# Altium footprint library con-molex.PCBLIB: 368 footprints (part 24 of 26)
Each footprint in its own frame and in the unit in brackets; x right, y up, seen from the top. Pads: shape width x height; smd on the part's side, far side on the other; paste and mask are expansions set on the pad; w line width, h text height; cw(c..) or ccw(c..) is an arc to the next point about the centre after c.
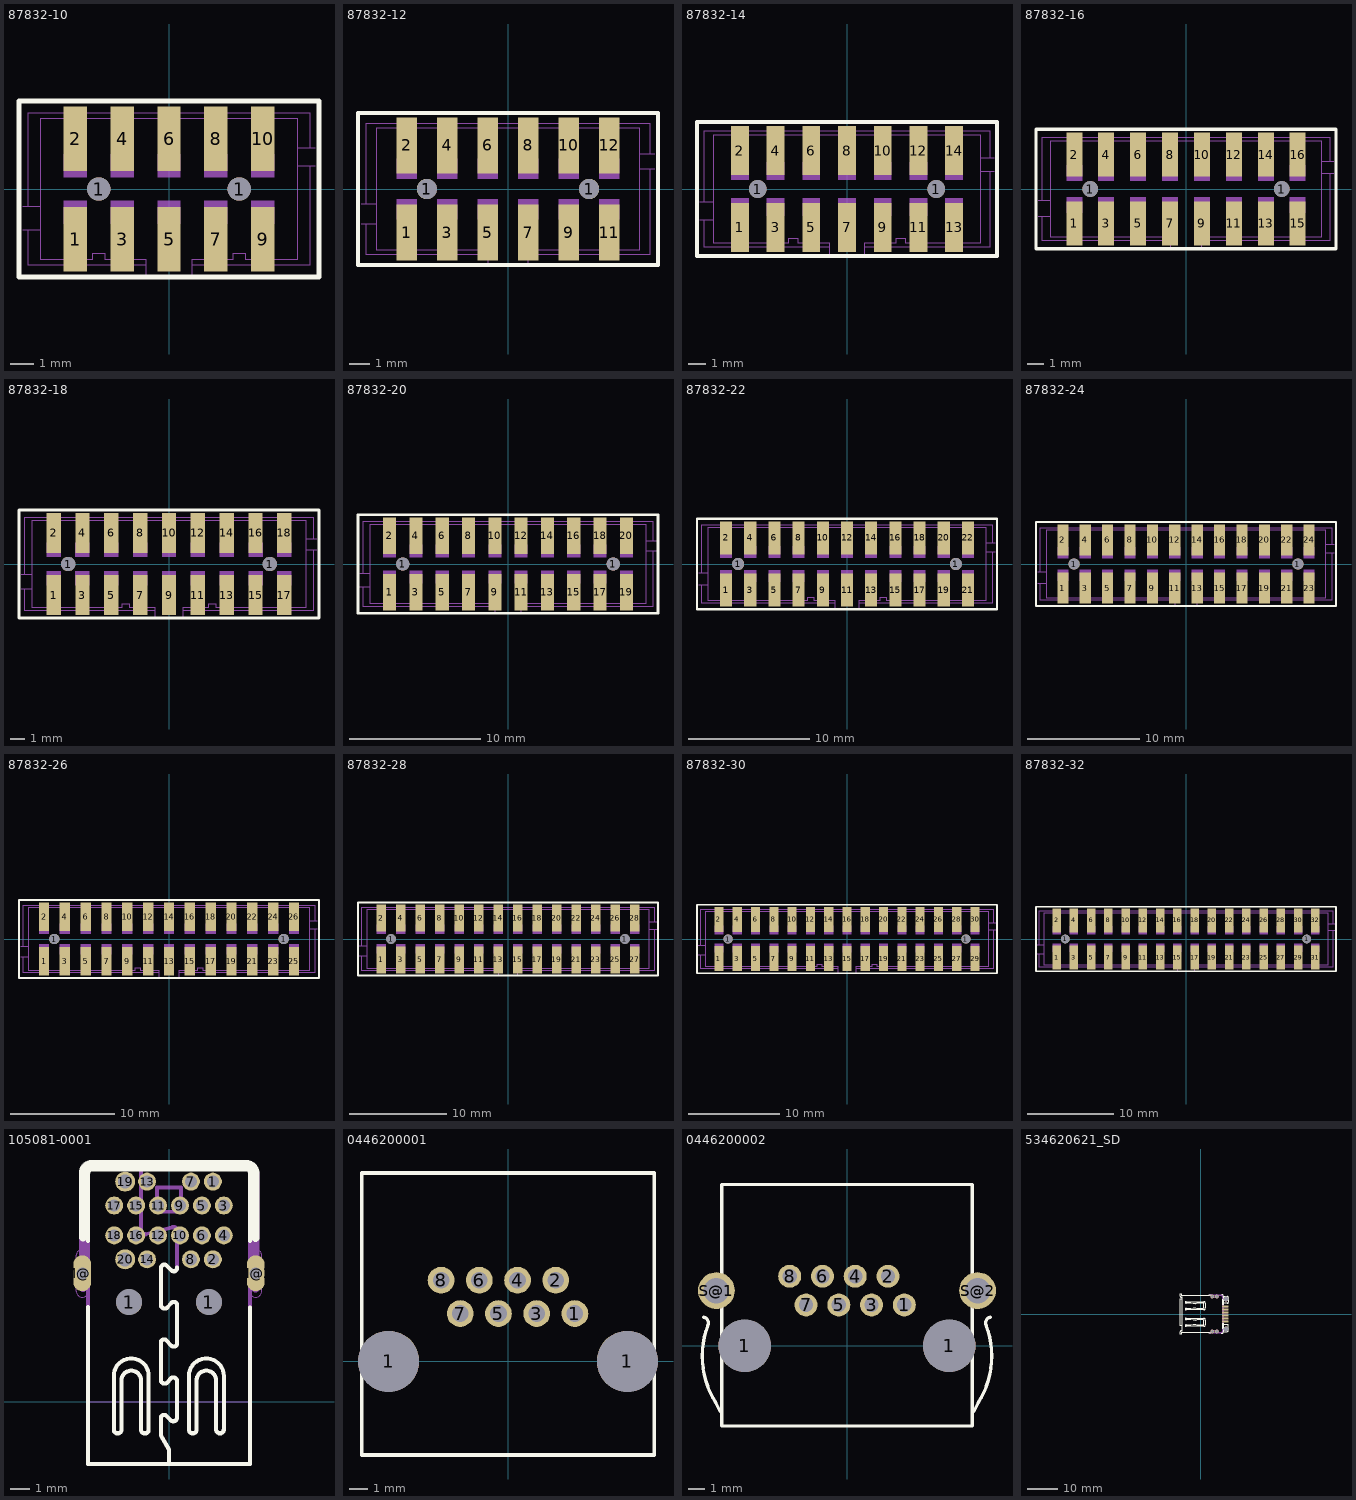
[diagram p23: the footprints below, top view; thin cyan lines are the x and y axes]

## 87832-10 [mm]
pads (12):
  rect 1x2.75 smd: 1(-4,-2.15) 2(-4,2.15) 3(-2,-2.15) 4(-2,2.15) 5(0,-2.15) 6(0,2.15) 7(2,-2.15) 8(2,2.15) 9(4,-2.15) 10(4,2.15)
  round 1 hole 1: 1(-3,0) 1(3,0)
Top Overlay:
  lines w0.203: -6.4,-3.75 6.4,-3.75 6.4,3.75 -6.4,3.75 -6.4,-3.75
Mechanical 16:
  rectangle: -4.5,0.5 -3.5,1.5
  rectangle: -2.5,0.5 -1.5,1.5
  rectangle: -0.5,0.5 0.5,1.5
  rectangle: 1.5,0.5 2.5,1.5
  rectangle: -4.5,-1.5 -3.5,-0.5
  rectangle: -2.5,-1.5 -1.5,-0.5
  rectangle: -0.5,-1.5 0.5,-0.5
  rectangle: 1.5,-1.5 2.5,-0.5
  rectangle: 3.5,0.5 4.5,1.5
  rectangle: 3.5,-1.5 4.5,-0.5
  lines w0.051: -6.25,-1.75 -6,-1.75 ; -6.25,-0.75 -6,-0.75 ; -1,-3.75 -1,-3.25 ; 1,-3.75 1,-3.25 ; 6.25,1 6,1 ; 6.25,1.75 6,1.75 ; -6,-1.75 -5.5,-1.75 ; -6,-1.75 -6,-3.25 -1,-3.25 ; -6,-0.75 -5.5,-0.75 ; -6,-0.75 -6,3.25 6,3.25 6,1.75 ; -5.5,-1.75 -5.5,-0.75 ; -5.5,-1.75 -5.5,-3 -3.25,-3 -3.25,-2.75 -2.75,-2.75 -2.75,-3 -1,-3 -1,-3.25 ; -5.5,-0.75 -5.5,3 -4.25,3 -4.25,2.75 -3.75,2.75 -3.75,3 -2.25,3 -2.25,2.75 -1.75,2.75 -1.75,3 -0.25,3 -0.25,2.75 0.25,2.75 0.25,3 1.75,3 1.75,2.75 2.25,2.75 2.25,3 3.75,3 3.75,2.75 4.25,2.75 4.25,3 5.5,3 5.5,1.75 ; 1,-3.25 1,-3 2.75,-3 2.75,-2.75 3.25,-2.75 3.25,-3 5.5,-3 5.5,1 ; 1,-3.25 6,-3.25 6,1 ; 5.5,1 5.5,1.75 ; 5.5,1 6,1 ; 5.5,1.75 6,1.75
  text "1" at -5.25,-2.75 h0.94

## 87832-12 [mm]
pads (14):
  rect 1x2.75 smd: 1(-5,-2.15) 2(-5,2.15) 3(-3,-2.15) 4(-3,2.15) 5(-1,-2.15) 6(-1,2.15) 7(1,-2.15) 8(1,2.15) 9(3,-2.15) 10(3,2.15) 11(5,-2.15) 12(5,2.15)
  round 1 hole 1: 1(-4,0) 1(4,0)
Top Overlay:
  lines w0.203: -7.4,-3.75 7.4,-3.75 7.4,3.75 -7.4,3.75 -7.4,-3.75
Mechanical 16:
  rectangle: -5.5,0.5 -4.5,1.5
  rectangle: -3.5,0.5 -2.5,1.5
  rectangle: -1.5,0.5 -0.5,1.5
  rectangle: 0.5,0.5 1.5,1.5
  rectangle: -5.5,-1.5 -4.5,-0.5
  rectangle: -3.5,-1.5 -2.5,-0.5
  rectangle: -1.5,-1.5 -0.5,-0.5
  rectangle: 0.5,-1.5 1.5,-0.5
  rectangle: 2.5,0.5 3.5,1.5
  rectangle: 2.5,-1.5 3.5,-0.5
  rectangle: 4.5,0.5 5.5,1.5
  rectangle: 4.5,-1.5 5.5,-0.5
  lines w0.051: -7.25,-1.75 -7,-1.75 ; -7.25,-0.75 -7,-0.75 ; -1,-3.75 -1,-3.25 ; 1,-3.75 1,-3.25 ; 7.25,1 7,1 ; 7.25,1.75 7,1.75 ; -7,-1.75 -6.5,-1.75 ; -7,-1.75 -7,-3.25 -1,-3.25 ; -7,-0.75 -6.5,-0.75 ; -7,-0.75 -7,3.25 7,3.25 7,1.75 ; -6.5,-1.75 -6.5,-0.75 ; -6.5,-1.75 -6.5,-3 -3.25,-3 -3.25,-2.75 -2.75,-2.75 -2.75,-3 -1,-3 -1,-3.25 ; -6.5,-0.75 -6.5,3 -5.25,3 -5.25,2.75 -4.75,2.75 -4.75,3 -3.25,3 -3.25,2.75 -2.75,2.75 -2.75,3 -1.25,3 -1.25,2.75 -0.75,2.75 -0.75,3 0.75,3 0.75,2.75 1.25,2.75 1.25,3 2.75,3 2.75,2.75 3.25,2.75 3.25,3 4.75,3 4.75,2.75 5.25,2.75 5.25,3 6.5,3 6.5,1.75 ; 1,-3.25 1,-3 2.75,-3 2.75,-2.75 3.25,-2.75 3.25,-3 6.5,-3 6.5,1 ; 1,-3.25 7,-3.25 7,1 ; 6.5,1 6.5,1.75 ; 6.5,1 7,1 ; 6.5,1.75 7,1.75
  text "1" at -6.25,-2.75 h0.94

## 87832-14 [mm]
pads (16):
  rect 1x2.75 smd: 1(-6,-2.15) 2(-6,2.15) 3(-4,-2.15) 4(-4,2.15) 5(-2,-2.15) 6(-2,2.15) 7(0,-2.15) 8(0,2.15) 9(2,-2.15) 10(2,2.15) 11(4,-2.15) 12(4,2.15) 13(6,-2.15) 14(6,2.15)
  round 1 hole 1: 1(-5,0) 1(5,0)
Top Overlay:
  lines w0.203: -8.4,-3.75 8.4,-3.75 8.4,3.75 -8.4,3.75 -8.4,-3.75
Mechanical 16:
  rectangle: -6.5,0.5 -5.5,1.5
  rectangle: -4.5,0.5 -3.5,1.5
  rectangle: -2.5,0.5 -1.5,1.5
  rectangle: -0.5,0.5 0.5,1.5
  rectangle: -6.5,-1.5 -5.5,-0.5
  rectangle: -4.5,-1.5 -3.5,-0.5
  rectangle: -2.5,-1.5 -1.5,-0.5
  rectangle: -0.5,-1.5 0.5,-0.5
  rectangle: 1.5,0.5 2.5,1.5
  rectangle: 1.5,-1.5 2.5,-0.5
  rectangle: 3.5,0.5 4.5,1.5
  rectangle: 3.5,-1.5 4.5,-0.5
  rectangle: 5.5,0.5 6.5,1.5
  rectangle: 5.5,-1.5 6.5,-0.5
  lines w0.051: -8.25,-1.75 -8,-1.75 ; -8.25,-0.75 -8,-0.75 ; -1,-3.75 -1,-3.25 ; 1,-3.75 1,-3.25 ; 8.25,1 8,1 ; 8.25,1.75 8,1.75 ; -8,-1.75 -7.5,-1.75 ; -8,-1.75 -8,-3.25 -1,-3.25 ; -8,-0.75 -7.5,-0.75 ; -8,-0.75 -8,3.25 8,3.25 8,1.75 ; -7.5,-1.75 -7.5,-0.75 ; -7.5,-1.75 -7.5,-3 -3.25,-3 -3.25,-2.75 -2.75,-2.75 -2.75,-3 -1,-3 -1,-3.25 ; -7.5,-0.75 -7.5,3 -6.25,3 -6.25,2.75 -5.75,2.75 -5.75,3 -4.25,3 -4.25,2.75 -3.75,2.75 -3.75,3 -2.25,3 -2.25,2.75 -1.75,2.75 -1.75,3 -0.25,3 -0.25,2.75 0.25,2.75 0.25,3 1.75,3 1.75,2.75 2.25,2.75 2.25,3 3.75,3 3.75,2.75 4.25,2.75 4.25,3 5.75,3 5.75,2.75 6.25,2.75 6.25,3 7.5,3 7.5,1.75 ; 1,-3.25 1,-3 2.75,-3 2.75,-2.75 3.25,-2.75 3.25,-3 7.5,-3 7.5,1 ; 1,-3.25 8,-3.25 8,1 ; 7.5,1 7.5,1.75 ; 7.5,1 8,1 ; 7.5,1.75 8,1.75
  text "1" at -7.25,-2.75 h0.94

## 87832-16 [mm]
pads (18):
  rect 1x2.75 smd: 1(-7,-2.15) 2(-7,2.15) 3(-5,-2.15) 4(-5,2.15) 5(-3,-2.15) 6(-3,2.15) 7(-1,-2.15) 8(-1,2.15) 9(1,-2.15) 10(1,2.15) 11(3,-2.15) 12(3,2.15) 13(5,-2.15) 14(5,2.15) 15(7,-2.15) 16(7,2.15)
  round 1 hole 1: 1(-6,0) 1(6,0)
Top Overlay:
  lines w0.203: -9.4,-3.75 9.4,-3.75 9.4,3.75 -9.4,3.75 -9.4,-3.75
Mechanical 16:
  rectangle: -7.5,0.5 -6.5,1.5
  rectangle: -5.5,0.5 -4.5,1.5
  rectangle: -3.5,0.5 -2.5,1.5
  rectangle: -1.5,0.5 -0.5,1.5
  rectangle: -7.5,-1.5 -6.5,-0.5
  rectangle: -5.5,-1.5 -4.5,-0.5
  rectangle: -3.5,-1.5 -2.5,-0.5
  rectangle: -1.5,-1.5 -0.5,-0.5
  rectangle: 0.5,0.5 1.5,1.5
  rectangle: 0.5,-1.5 1.5,-0.5
  rectangle: 2.5,0.5 3.5,1.5
  rectangle: 2.5,-1.5 3.5,-0.5
  rectangle: 4.5,0.5 5.5,1.5
  rectangle: 4.5,-1.5 5.5,-0.5
  rectangle: 6.5,0.5 7.5,1.5
  rectangle: 6.5,-1.5 7.5,-0.5
  lines w0.051: -9.25,-1.75 -9,-1.75 ; -9.25,-0.75 -9,-0.75 ; -1,-3.75 -1,-3.25 ; 1,-3.75 1,-3.25 ; 9.25,1 9,1 ; 9.25,1.75 9,1.75 ; -9,-1.75 -8.5,-1.75 ; -9,-1.75 -9,-3.25 -1,-3.25 ; -9,-0.75 -8.5,-0.75 ; -9,-0.75 -9,3.25 9,3.25 9,1.75 ; -8.5,-1.75 -8.5,-0.75 ; -8.5,-1.75 -8.5,-3 -3.25,-3 -3.25,-2.75 -2.75,-2.75 -2.75,-3 -1,-3 -1,-3.25 ; -8.5,-0.75 -8.5,3 -7.25,3 -7.25,2.75 -6.75,2.75 -6.75,3 -5.25,3 -5.25,2.75 -4.75,2.75 -4.75,3 -3.25,3 -3.25,2.75 -2.75,2.75 -2.75,3 -1.25,3 -1.25,2.75 -0.75,2.75 -0.75,3 0.75,3 0.75,2.75 1.25,2.75 1.25,3 2.75,3 2.75,2.75 3.25,2.75 3.25,3 4.75,3 4.75,2.75 5.25,2.75 5.25,3 6.75,3 6.75,2.75 7.25,2.75 7.25,3 8.5,3 8.5,1.75 ; 1,-3.25 1,-3 2.75,-3 2.75,-2.75 3.25,-2.75 3.25,-3 8.5,-3 8.5,1 ; 1,-3.25 9,-3.25 9,1 ; 8.5,1 8.5,1.75 ; 8.5,1 9,1 ; 8.5,1.75 9,1.75
  text "1" at -8.25,-2.75 h0.94

## 87832-18 [mm]
pads (20):
  rect 1x2.75 smd: 1(-8,-2.15) 2(-8,2.15) 3(-6,-2.15) 4(-6,2.15) 5(-4,-2.15) 6(-4,2.15) 7(-2,-2.15) 8(-2,2.15) 9(0,-2.15) 10(0,2.15) 11(2,-2.15) 12(2,2.15) 13(4,-2.15) 14(4,2.15) 15(6,-2.15) 16(6,2.15) 17(8,-2.15) 18(8,2.15)
  round 1 hole 1: 1(-7,0) 1(7,0)
Top Overlay:
  lines w0.203: -10.4,-3.75 10.4,-3.75 10.4,3.75 -10.4,3.75 -10.4,-3.75
Mechanical 16:
  rectangle: -8.5,0.5 -7.5,1.5
  rectangle: -6.5,0.5 -5.5,1.5
  rectangle: -4.5,0.5 -3.5,1.5
  rectangle: -2.5,0.5 -1.5,1.5
  rectangle: -8.5,-1.5 -7.5,-0.5
  rectangle: -6.5,-1.5 -5.5,-0.5
  rectangle: -4.5,-1.5 -3.5,-0.5
  rectangle: -2.5,-1.5 -1.5,-0.5
  rectangle: -0.5,0.5 0.5,1.5
  rectangle: -0.5,-1.5 0.5,-0.5
  rectangle: 1.5,0.5 2.5,1.5
  rectangle: 1.5,-1.5 2.5,-0.5
  rectangle: 3.5,0.5 4.5,1.5
  rectangle: 3.5,-1.5 4.5,-0.5
  rectangle: 5.5,0.5 6.5,1.5
  rectangle: 5.5,-1.5 6.5,-0.5
  rectangle: 7.5,0.5 8.5,1.5
  rectangle: 7.5,-1.5 8.5,-0.5
  lines w0.051: -10.25,-1.75 -10,-1.75 ; -10.25,-0.75 -10,-0.75 ; -1,-3.75 -1,-3.25 ; 1,-3.75 1,-3.25 ; 10.25,1 10,1 ; 10.25,1.75 10,1.75 ; -10,-1.75 -9.5,-1.75 ; -10,-1.75 -10,-3.25 -1,-3.25 ; -10,-0.75 -9.5,-0.75 ; -10,-0.75 -10,3.25 10,3.25 10,1.75 ; -9.5,-1.75 -9.5,-0.75 ; -9.5,-1.75 -9.5,-3 -3.25,-3 -3.25,-2.75 -2.75,-2.75 -2.75,-3 -1,-3 -1,-3.25 ; -9.5,-0.75 -9.5,3 -8.25,3 -8.25,2.75 -7.75,2.75 -7.75,3 -6.25,3 -6.25,2.75 -5.75,2.75 -5.75,3 -4.25,3 -4.25,2.75 -3.75,2.75 -3.75,3 -2.25,3 -2.25,2.75 -1.75,2.75 -1.75,3 -0.25,3 -0.25,2.75 0.25,2.75 0.25,3 1.75,3 1.75,2.75 2.25,2.75 2.25,3 3.75,3 3.75,2.75 4.25,2.75 4.25,3 5.75,3 5.75,2.75 6.25,2.75 6.25,3 7.75,3 7.75,2.75 8.25,2.75 8.25,3 9.5,3 9.5,1.75 ; 1,-3.25 1,-3 2.75,-3 2.75,-2.75 3.25,-2.75 3.25,-3 9.5,-3 9.5,1 ; 1,-3.25 10,-3.25 10,1 ; 9.5,1 9.5,1.75 ; 9.5,1 10,1 ; 9.5,1.75 10,1.75
  text "1" at -9.25,-2.75 h0.94

## 87832-20 [mm]
pads (22):
  rect 1x2.75 smd: 1(-9,-2.15) 2(-9,2.15) 3(-7,-2.15) 4(-7,2.15) 5(-5,-2.15) 6(-5,2.15) 7(-3,-2.15) 8(-3,2.15) 9(-1,-2.15) 10(-1,2.15) 11(1,-2.15) 12(1,2.15) 13(3,-2.15) 14(3,2.15) 15(5,-2.15) 16(5,2.15) 17(7,-2.15) 18(7,2.15) 19(9,-2.15) 20(9,2.15)
  round 1 hole 1: 1(-8,0) 1(8,0)
Top Overlay:
  lines w0.203: -11.4,-3.75 11.4,-3.75 11.4,3.75 -11.4,3.75 -11.4,-3.75
Mechanical 16:
  rectangle: -9.5,0.5 -8.5,1.5
  rectangle: -7.5,0.5 -6.5,1.5
  rectangle: -5.5,0.5 -4.5,1.5
  rectangle: -3.5,0.5 -2.5,1.5
  rectangle: -9.5,-1.5 -8.5,-0.5
  rectangle: -7.5,-1.5 -6.5,-0.5
  rectangle: -5.5,-1.5 -4.5,-0.5
  rectangle: -3.5,-1.5 -2.5,-0.5
  rectangle: -1.5,0.5 -0.5,1.5
  rectangle: -1.5,-1.5 -0.5,-0.5
  rectangle: 0.5,0.5 1.5,1.5
  rectangle: 0.5,-1.5 1.5,-0.5
  rectangle: 2.5,0.5 3.5,1.5
  rectangle: 2.5,-1.5 3.5,-0.5
  rectangle: 4.5,0.5 5.5,1.5
  rectangle: 4.5,-1.5 5.5,-0.5
  rectangle: 6.5,0.5 7.5,1.5
  rectangle: 6.5,-1.5 7.5,-0.5
  rectangle: 8.5,0.5 9.5,1.5
  rectangle: 8.5,-1.5 9.5,-0.5
  lines w0.051: -11.25,-1.75 -11,-1.75 ; -11.25,-0.75 -11,-0.75 ; -1,-3.75 -1,-3.25 ; 1,-3.75 1,-3.25 ; 11.25,1 11,1 ; 11.25,1.75 11,1.75 ; -11,-1.75 -10.5,-1.75 ; -11,-1.75 -11,-3.25 -1,-3.25 ; -11,-0.75 -10.5,-0.75 ; -11,-0.75 -11,3.25 11,3.25 11,1.75 ; -10.5,-1.75 -10.5,-0.75 ; -10.5,-1.75 -10.5,-3 -3.25,-3 -3.25,-2.75 -2.75,-2.75 -2.75,-3 -1,-3 -1,-3.25 ; -10.5,-0.75 -10.5,3 -9.25,3 -9.25,2.75 -8.75,2.75 -8.75,3 -7.25,3 -7.25,2.75 -6.75,2.75 -6.75,3 -5.25,3 -5.25,2.75 -4.75,2.75 -4.75,3 -3.25,3 -3.25,2.75 -2.75,2.75 -2.75,3 -1.25,3 -1.25,2.75 -0.75,2.75 -0.75,3 0.75,3 0.75,2.75 1.25,2.75 1.25,3 2.75,3 2.75,2.75 3.25,2.75 3.25,3 4.75,3 4.75,2.75 5.25,2.75 5.25,3 6.75,3 6.75,2.75 7.25,2.75 7.25,3 8.75,3 8.75,2.75 9.25,2.75 9.25,3 10.5,3 10.5,1.75 ; 1,-3.25 1,-3 2.75,-3 2.75,-2.75 3.25,-2.75 3.25,-3 10.5,-3 10.5,1 ; 1,-3.25 11,-3.25 11,1 ; 10.5,1 10.5,1.75 ; 10.5,1 11,1 ; 10.5,1.75 11,1.75
  text "1" at -10.25,-2.75 h0.94

## 87832-22 [mm]
pads (24):
  rect 1x2.75 smd: 1(-10,-2.15) 2(-10,2.15) 3(-8,-2.15) 4(-8,2.15) 5(-6,-2.15) 6(-6,2.15) 7(-4,-2.15) 8(-4,2.15) 9(-2,-2.15) 10(-2,2.15) 11(0,-2.15) 12(0,2.15) 13(2,-2.15) 14(2,2.15) 15(4,-2.15) 16(4,2.15) 17(6,-2.15) 18(6,2.15) 19(8,-2.15) 20(8,2.15) 21(10,-2.15) 22(10,2.15)
  round 1 hole 1: 1(-9,0) 1(9,0)
Top Overlay:
  lines w0.203: -12.4,-3.75 12.4,-3.75 12.4,3.75 -12.4,3.75 -12.4,-3.75
Mechanical 16:
  rectangle: -10.5,0.5 -9.5,1.5
  rectangle: -8.5,0.5 -7.5,1.5
  rectangle: -6.5,0.5 -5.5,1.5
  rectangle: -4.5,0.5 -3.5,1.5
  rectangle: -10.5,-1.5 -9.5,-0.5
  rectangle: -8.5,-1.5 -7.5,-0.5
  rectangle: -6.5,-1.5 -5.5,-0.5
  rectangle: -4.5,-1.5 -3.5,-0.5
  rectangle: -2.5,0.5 -1.5,1.5
  rectangle: -2.5,-1.5 -1.5,-0.5
  rectangle: -0.5,0.5 0.5,1.5
  rectangle: -0.5,-1.5 0.5,-0.5
  rectangle: 1.5,0.5 2.5,1.5
  rectangle: 1.5,-1.5 2.5,-0.5
  rectangle: 3.5,0.5 4.5,1.5
  rectangle: 3.5,-1.5 4.5,-0.5
  rectangle: 5.5,0.5 6.5,1.5
  rectangle: 5.5,-1.5 6.5,-0.5
  rectangle: 7.5,0.5 8.5,1.5
  rectangle: 7.5,-1.5 8.5,-0.5
  rectangle: 9.5,0.5 10.5,1.5
  rectangle: 9.5,-1.5 10.5,-0.5
  lines w0.051: -12.25,-1.75 -12,-1.75 ; -12.25,-0.75 -12,-0.75 ; -1,-3.75 -1,-3.25 ; 1,-3.75 1,-3.25 ; 12.25,1 12,1 ; 12.25,1.75 12,1.75 ; -12,-1.75 -11.5,-1.75 ; -12,-1.75 -12,-3.25 -1,-3.25 ; -12,-0.75 -11.5,-0.75 ; -12,-0.75 -12,3.25 12,3.25 12,1.75 ; -11.5,-1.75 -11.5,-0.75 ; -11.5,-1.75 -11.5,-3 -3.25,-3 -3.25,-2.75 -2.75,-2.75 -2.75,-3 -1,-3 -1,-3.25 ; -11.5,-0.75 -11.5,3 -10.25,3 -10.25,2.75 -9.75,2.75 -9.75,3 -8.25,3 -8.25,2.75 -7.75,2.75 -7.75,3 -6.25,3 -6.25,2.75 -5.75,2.75 -5.75,3 -4.25,3 -4.25,2.75 -3.75,2.75 -3.75,3 -2.25,3 -2.25,2.75 -1.75,2.75 -1.75,3 -0.25,3 -0.25,2.75 0.25,2.75 0.25,3 1.75,3 1.75,2.75 2.25,2.75 2.25,3 3.75,3 3.75,2.75 4.25,2.75 4.25,3 5.75,3 5.75,2.75 6.25,2.75 6.25,3 7.75,3 7.75,2.75 8.25,2.75 8.25,3 9.75,3 9.75,2.75 10.25,2.75 10.25,3 11.5,3 11.5,1.75 ; 1,-3.25 1,-3 2.75,-3 2.75,-2.75 3.25,-2.75 3.25,-3 11.5,-3 11.5,1 ; 1,-3.25 12,-3.25 12,1 ; 11.5,1 11.5,1.75 ; 11.5,1 12,1 ; 11.5,1.75 12,1.75
  text "1" at -11.25,-2.75 h0.94

## 87832-24 [mm]
pads (26):
  rect 1x2.75 smd: 1(-11,-2.15) 2(-11,2.15) 3(-9,-2.15) 4(-9,2.15) 5(-7,-2.15) 6(-7,2.15) 7(-5,-2.15) 8(-5,2.15) 9(-3,-2.15) 10(-3,2.15) 11(-1,-2.15) 12(-1,2.15) 13(1,-2.15) 14(1,2.15) 15(3,-2.15) 16(3,2.15) 17(5,-2.15) 18(5,2.15) 19(7,-2.15) 20(7,2.15) 21(9,-2.15) 22(9,2.15) 23(11,-2.15) 24(11,2.15)
  round 1 hole 1: 1(-10,0) 1(10,0)
Top Overlay:
  lines w0.203: -13.4,-3.75 13.4,-3.75 13.4,3.75 -13.4,3.75 -13.4,-3.75
Mechanical 16:
  rectangle: -11.5,0.5 -10.5,1.5
  rectangle: -9.5,0.5 -8.5,1.5
  rectangle: -7.5,0.5 -6.5,1.5
  rectangle: -5.5,0.5 -4.5,1.5
  rectangle: -11.5,-1.5 -10.5,-0.5
  rectangle: -9.5,-1.5 -8.5,-0.5
  rectangle: -7.5,-1.5 -6.5,-0.5
  rectangle: -5.5,-1.5 -4.5,-0.5
  rectangle: -3.5,0.5 -2.5,1.5
  rectangle: -3.5,-1.5 -2.5,-0.5
  rectangle: -1.5,0.5 -0.5,1.5
  rectangle: -1.5,-1.5 -0.5,-0.5
  rectangle: 0.5,0.5 1.5,1.5
  rectangle: 0.5,-1.5 1.5,-0.5
  rectangle: 2.5,0.5 3.5,1.5
  rectangle: 2.5,-1.5 3.5,-0.5
  rectangle: 4.5,0.5 5.5,1.5
  rectangle: 4.5,-1.5 5.5,-0.5
  rectangle: 6.5,0.5 7.5,1.5
  rectangle: 6.5,-1.5 7.5,-0.5
  rectangle: 8.5,0.5 9.5,1.5
  rectangle: 8.5,-1.5 9.5,-0.5
  rectangle: 10.5,0.5 11.5,1.5
  rectangle: 10.5,-1.5 11.5,-0.5
  lines w0.051: -13.25,-1.75 -13,-1.75 ; -13.25,-0.75 -13,-0.75 ; -1,-3.75 -1,-3.25 ; 1,-3.75 1,-3.25 ; 13.25,1 13,1 ; 13.25,1.75 13,1.75 ; -13,-1.75 -12.5,-1.75 ; -13,-1.75 -13,-3.25 -1,-3.25 ; -13,-0.75 -12.5,-0.75 ; -13,-0.75 -13,3.25 13,3.25 13,1.75 ; -12.5,-1.75 -12.5,-0.75 ; -12.5,-1.75 -12.5,-3 -3.25,-3 -3.25,-2.75 -2.75,-2.75 -2.75,-3 -1,-3 -1,-3.25 ; -12.5,-0.75 -12.5,3 -11.25,3 -11.25,2.75 -10.75,2.75 -10.75,3 -9.25,3 -9.25,2.75 -8.75,2.75 -8.75,3 -7.25,3 -7.25,2.75 -6.75,2.75 -6.75,3 -5.25,3 -5.25,2.75 -4.75,2.75 -4.75,3 -3.25,3 -3.25,2.75 -2.75,2.75 -2.75,3 -1.25,3 -1.25,2.75 -0.75,2.75 -0.75,3 0.75,3 0.75,2.75 1.25,2.75 1.25,3 2.75,3 2.75,2.75 3.25,2.75 3.25,3 4.75,3 4.75,2.75 5.25,2.75 5.25,3 6.75,3 6.75,2.75 7.25,2.75 7.25,3 8.75,3 8.75,2.75 9.25,2.75 9.25,3 10.75,3 10.75,2.75 11.25,2.75 11.25,3 12.5,3 12.5,1.75 ; 1,-3.25 1,-3 2.75,-3 2.75,-2.75 3.25,-2.75 3.25,-3 12.5,-3 12.5,1 ; 1,-3.25 13,-3.25 13,1 ; 12.5,1 12.5,1.75 ; 12.5,1 13,1 ; 12.5,1.75 13,1.75
  text "1" at -12.25,-2.75 h0.94

## 87832-26 [mm]
pads (28):
  rect 1x2.75 smd: 1(-12,-2.15) 2(-12,2.15) 3(-10,-2.15) 4(-10,2.15) 5(-8,-2.15) 6(-8,2.15) 7(-6,-2.15) 8(-6,2.15) 9(-4,-2.15) 10(-4,2.15) 11(-2,-2.15) 12(-2,2.15) 13(0,-2.15) 14(0,2.15) 15(2,-2.15) 16(2,2.15) 17(4,-2.15) 18(4,2.15) 19(6,-2.15) 20(6,2.15) 21(8,-2.15) 22(8,2.15) 23(10,-2.15) 24(10,2.15) 25(12,-2.15) 26(12,2.15)
  round 1 hole 1: 1(-11,0) 1(11,0)
Top Overlay:
  lines w0.203: -14.4,-3.75 14.4,-3.75 14.4,3.75 -14.4,3.75 -14.4,-3.75
Mechanical 16:
  rectangle: -12.5,0.5 -11.5,1.5
  rectangle: -10.5,0.5 -9.5,1.5
  rectangle: -8.5,0.5 -7.5,1.5
  rectangle: -6.5,0.5 -5.5,1.5
  rectangle: -12.5,-1.5 -11.5,-0.5
  rectangle: -10.5,-1.5 -9.5,-0.5
  rectangle: -8.5,-1.5 -7.5,-0.5
  rectangle: -6.5,-1.5 -5.5,-0.5
  rectangle: -4.5,0.5 -3.5,1.5
  rectangle: -4.5,-1.5 -3.5,-0.5
  rectangle: -2.5,0.5 -1.5,1.5
  rectangle: -2.5,-1.5 -1.5,-0.5
  rectangle: -0.5,0.5 0.5,1.5
  rectangle: -0.5,-1.5 0.5,-0.5
  rectangle: 1.5,0.5 2.5,1.5
  rectangle: 1.5,-1.5 2.5,-0.5
  rectangle: 3.5,0.5 4.5,1.5
  rectangle: 3.5,-1.5 4.5,-0.5
  rectangle: 5.5,0.5 6.5,1.5
  rectangle: 5.5,-1.5 6.5,-0.5
  rectangle: 7.5,0.5 8.5,1.5
  rectangle: 7.5,-1.5 8.5,-0.5
  rectangle: 9.5,0.5 10.5,1.5
  rectangle: 9.5,-1.5 10.5,-0.5
  rectangle: 11.5,0.5 12.5,1.5
  rectangle: 11.5,-1.5 12.5,-0.5
  lines w0.051: -14.25,-1.75 -14,-1.75 ; -14.25,-0.75 -14,-0.75 ; -1,-3.75 -1,-3.25 ; 1,-3.75 1,-3.25 ; 14.25,1 14,1 ; 14.25,1.75 14,1.75 ; -14,-1.75 -13.5,-1.75 ; -14,-1.75 -14,-3.25 -1,-3.25 ; -14,-0.75 -13.5,-0.75 ; -14,-0.75 -14,3.25 14,3.25 14,1.75 ; -13.5,-1.75 -13.5,-0.75 ; -13.5,-1.75 -13.5,-3 -3.25,-3 -3.25,-2.75 -2.75,-2.75 -2.75,-3 -1,-3 -1,-3.25 ; -13.5,-0.75 -13.5,3 -12.25,3 -12.25,2.75 -11.75,2.75 -11.75,3 -10.25,3 -10.25,2.75 -9.75,2.75 -9.75,3 -8.25,3 -8.25,2.75 -7.75,2.75 -7.75,3 -6.25,3 -6.25,2.75 -5.75,2.75 -5.75,3 -4.25,3 -4.25,2.75 -3.75,2.75 -3.75,3 -2.25,3 -2.25,2.75 -1.75,2.75 -1.75,3 -0.25,3 -0.25,2.75 0.25,2.75 0.25,3 1.75,3 1.75,2.75 2.25,2.75 2.25,3 3.75,3 3.75,2.75 4.25,2.75 4.25,3 5.75,3 5.75,2.75 6.25,2.75 6.25,3 7.75,3 7.75,2.75 8.25,2.75 8.25,3 9.75,3 9.75,2.75 10.25,2.75 10.25,3 11.75,3 11.75,2.75 12.25,2.75 12.25,3 13.5,3 13.5,1.75 ; 1,-3.25 1,-3 2.75,-3 2.75,-2.75 3.25,-2.75 3.25,-3 13.5,-3 13.5,1 ; 1,-3.25 14,-3.25 14,1 ; 13.5,1 13.5,1.75 ; 13.5,1 14,1 ; 13.5,1.75 14,1.75
  text "1" at -13.25,-2.75 h0.94

## 87832-28 [mm]
pads (30):
  rect 1x2.75 smd: 1(-13,-2.15) 2(-13,2.15) 3(-11,-2.15) 4(-11,2.15) 5(-9,-2.15) 6(-9,2.15) 7(-7,-2.15) 8(-7,2.15) 9(-5,-2.15) 10(-5,2.15) 11(-3,-2.15) 12(-3,2.15) 13(-1,-2.15) 14(-1,2.15) 15(1,-2.15) 16(1,2.15) 17(3,-2.15) 18(3,2.15) 19(5,-2.15) 20(5,2.15) 21(7,-2.15) 22(7,2.15) 23(9,-2.15) 24(9,2.15) 25(11,-2.15) 26(11,2.15) 27(13,-2.15) 28(13,2.15)
  round 1 hole 1: 1(-12,0) 1(12,0)
Top Overlay:
  lines w0.203: -15.4,-3.75 15.4,-3.75 15.4,3.75 -15.4,3.75 -15.4,-3.75
Mechanical 16:
  rectangle: -13.5,0.5 -12.5,1.5
  rectangle: -11.5,0.5 -10.5,1.5
  rectangle: -9.5,0.5 -8.5,1.5
  rectangle: -7.5,0.5 -6.5,1.5
  rectangle: -13.5,-1.5 -12.5,-0.5
  rectangle: -11.5,-1.5 -10.5,-0.5
  rectangle: -9.5,-1.5 -8.5,-0.5
  rectangle: -7.5,-1.5 -6.5,-0.5
  rectangle: -5.5,0.5 -4.5,1.5
  rectangle: -5.5,-1.5 -4.5,-0.5
  rectangle: -3.5,0.5 -2.5,1.5
  rectangle: -3.5,-1.5 -2.5,-0.5
  rectangle: -1.5,0.5 -0.5,1.5
  rectangle: -1.5,-1.5 -0.5,-0.5
  rectangle: 0.5,0.5 1.5,1.5
  rectangle: 0.5,-1.5 1.5,-0.5
  rectangle: 2.5,0.5 3.5,1.5
  rectangle: 2.5,-1.5 3.5,-0.5
  rectangle: 4.5,0.5 5.5,1.5
  rectangle: 4.5,-1.5 5.5,-0.5
  rectangle: 6.5,0.5 7.5,1.5
  rectangle: 6.5,-1.5 7.5,-0.5
  rectangle: 8.5,0.5 9.5,1.5
  rectangle: 8.5,-1.5 9.5,-0.5
  rectangle: 10.5,0.5 11.5,1.5
  rectangle: 10.5,-1.5 11.5,-0.5
  rectangle: 12.5,0.5 13.5,1.5
  rectangle: 12.5,-1.5 13.5,-0.5
  lines w0.051: -15.25,-1.75 -15,-1.75 ; -15.25,-0.75 -15,-0.75 ; -1,-3.75 -1,-3.25 ; 1,-3.75 1,-3.25 ; 15.25,1 15,1 ; 15.25,1.75 15,1.75 ; -15,-1.75 -14.5,-1.75 ; -15,-1.75 -15,-3.25 -1,-3.25 ; -15,-0.75 -14.5,-0.75 ; -15,-0.75 -15,3.25 15,3.25 15,1.75 ; -14.5,-1.75 -14.5,-0.75 ; -14.5,-1.75 -14.5,-3 -3.25,-3 -3.25,-2.75 -2.75,-2.75 -2.75,-3 -1,-3 -1,-3.25 ; -14.5,-0.75 -14.5,3 -13.25,3 -13.25,2.75 -12.75,2.75 -12.75,3 -11.25,3 -11.25,2.75 -10.75,2.75 -10.75,3 -9.25,3 -9.25,2.75 -8.75,2.75 -8.75,3 -7.25,3 -7.25,2.75 -6.75,2.75 -6.75,3 -5.25,3 -5.25,2.75 -4.75,2.75 -4.75,3 -3.25,3 -3.25,2.75 -2.75,2.75 -2.75,3 -1.25,3 -1.25,2.75 -0.75,2.75 -0.75,3 0.75,3 0.75,2.75 1.25,2.75 1.25,3 2.75,3 2.75,2.75 3.25,2.75 3.25,3 4.75,3 4.75,2.75 5.25,2.75 5.25,3 6.75,3 6.75,2.75 7.25,2.75 7.25,3 8.75,3 8.75,2.75 9.25,2.75 9.25,3 10.75,3 10.75,2.75 11.25,2.75 11.25,3 12.75,3 12.75,2.75 13.25,2.75 13.25,3 14.5,3 14.5,1.75 ; 1,-3.25 1,-3 2.75,-3 2.75,-2.75 3.25,-2.75 3.25,-3 14.5,-3 14.5,1 ; 1,-3.25 15,-3.25 15,1 ; 14.5,1 14.5,1.75 ; 14.5,1 15,1 ; 14.5,1.75 15,1.75
  text "1" at -14.25,-2.75 h0.94

## 87832-30 [mm]
pads (32):
  rect 1x2.75 smd: 1(-14,-2.15) 2(-14,2.15) 3(-12,-2.15) 4(-12,2.15) 5(-10,-2.15) 6(-10,2.15) 7(-8,-2.15) 8(-8,2.15) 9(-6,-2.15) 10(-6,2.15) 11(-4,-2.15) 12(-4,2.15) 13(-2,-2.15) 14(-2,2.15) 15(0,-2.15) 16(0,2.15) 17(2,-2.15) 18(2,2.15) 19(4,-2.15) 20(4,2.15) 21(6,-2.15) 22(6,2.15) 23(8,-2.15) 24(8,2.15) 25(10,-2.15) 26(10,2.15) 27(12,-2.15) 28(12,2.15) 29(14,-2.15) 30(14,2.15)
  round 1 hole 1: 1(-13,0) 1(13,0)
Top Overlay:
  lines w0.203: -16.4,-3.75 16.4,-3.75 16.4,3.75 -16.4,3.75 -16.4,-3.75
Mechanical 16:
  rectangle: -14.5,0.5 -13.5,1.5
  rectangle: -12.5,0.5 -11.5,1.5
  rectangle: -10.5,0.5 -9.5,1.5
  rectangle: -8.5,0.5 -7.5,1.5
  rectangle: -14.5,-1.5 -13.5,-0.5
  rectangle: -12.5,-1.5 -11.5,-0.5
  rectangle: -10.5,-1.5 -9.5,-0.5
  rectangle: -8.5,-1.5 -7.5,-0.5
  rectangle: -6.5,0.5 -5.5,1.5
  rectangle: -6.5,-1.5 -5.5,-0.5
  rectangle: -4.5,0.5 -3.5,1.5
  rectangle: -4.5,-1.5 -3.5,-0.5
  rectangle: -2.5,0.5 -1.5,1.5
  rectangle: -2.5,-1.5 -1.5,-0.5
  rectangle: -0.5,0.5 0.5,1.5
  rectangle: -0.5,-1.5 0.5,-0.5
  rectangle: 1.5,0.5 2.5,1.5
  rectangle: 1.5,-1.5 2.5,-0.5
  rectangle: 3.5,0.5 4.5,1.5
  rectangle: 3.5,-1.5 4.5,-0.5
  rectangle: 5.5,0.5 6.5,1.5
  rectangle: 5.5,-1.5 6.5,-0.5
  rectangle: 7.5,0.5 8.5,1.5
  rectangle: 7.5,-1.5 8.5,-0.5
  rectangle: 9.5,0.5 10.5,1.5
  rectangle: 9.5,-1.5 10.5,-0.5
  rectangle: 11.5,0.5 12.5,1.5
  rectangle: 11.5,-1.5 12.5,-0.5
  rectangle: 13.5,0.5 14.5,1.5
  rectangle: 13.5,-1.5 14.5,-0.5
  lines w0.051: -16.25,-1.75 -16,-1.75 ; -16.25,-0.75 -16,-0.75 ; -1,-3.75 -1,-3.25 ; 1,-3.75 1,-3.25 ; 16.25,1 16,1 ; 16.25,1.75 16,1.75 ; -16,-1.75 -15.5,-1.75 ; -16,-1.75 -16,-3.25 -1,-3.25 ; -16,-0.75 -15.5,-0.75 ; -16,-0.75 -16,3.25 16,3.25 16,1.75 ; -15.5,-1.75 -15.5,-0.75 ; -15.5,-1.75 -15.5,-3 -3.25,-3 -3.25,-2.75 -2.75,-2.75 -2.75,-3 -1,-3 -1,-3.25 ; -15.5,-0.75 -15.5,3 -14.25,3 -14.25,2.75 -13.75,2.75 -13.75,3 -12.25,3 -12.25,2.75 -11.75,2.75 -11.75,3 -10.25,3 -10.25,2.75 -9.75,2.75 -9.75,3 -8.25,3 -8.25,2.75 -7.75,2.75 -7.75,3 -6.25,3 -6.25,2.75 -5.75,2.75 -5.75,3 -4.25,3 -4.25,2.75 -3.75,2.75 -3.75,3 -2.25,3 -2.25,2.75 -1.75,2.75 -1.75,3 -0.25,3 -0.25,2.75 0.25,2.75 0.25,3 1.75,3 1.75,2.75 2.25,2.75 2.25,3 3.75,3 3.75,2.75 4.25,2.75 4.25,3 5.75,3 5.75,2.75 6.25,2.75 6.25,3 7.75,3 7.75,2.75 8.25,2.75 8.25,3 9.75,3 9.75,2.75 10.25,2.75 10.25,3 11.75,3 11.75,2.75 12.25,2.75 12.25,3 13.75,3 13.75,2.75 14.25,2.75 14.25,3 15.5,3 15.5,1.75 ; 1,-3.25 1,-3 2.75,-3 2.75,-2.75 3.25,-2.75 3.25,-3 15.5,-3 15.5,1 ; 1,-3.25 16,-3.25 16,1 ; 15.5,1 15.5,1.75 ; 15.5,1 16,1 ; 15.5,1.75 16,1.75
  text "1" at -15.25,-2.75 h0.94

## 87832-32 [mm]
pads (34):
  rect 1x2.75 smd: 1(-15,-2.15) 2(-15,2.15) 3(-13,-2.15) 4(-13,2.15) 5(-11,-2.15) 6(-11,2.15) 7(-9,-2.15) 8(-9,2.15) 9(-7,-2.15) 10(-7,2.15) 11(-5,-2.15) 12(-5,2.15) 13(-3,-2.15) 14(-3,2.15) 15(-1,-2.15) 16(-1,2.15) 17(1,-2.15) 18(1,2.15) 19(3,-2.15) 20(3,2.15) 21(5,-2.15) 22(5,2.15) 23(7,-2.15) 24(7,2.15) 25(9,-2.15) 26(9,2.15) 27(11,-2.15) 28(11,2.15) 29(13,-2.15) 30(13,2.15) 31(15,-2.15) 32(15,2.15)
  round 1 hole 1: 1(-14,0) 1(14,0)
Top Overlay:
  lines w0.203: -17.4,-3.75 17.4,-3.75 17.4,3.75 -17.4,3.75 -17.4,-3.75
Mechanical 16:
  rectangle: -15.5,0.5 -14.5,1.5
  rectangle: -13.5,0.5 -12.5,1.5
  rectangle: -11.5,0.5 -10.5,1.5
  rectangle: -9.5,0.5 -8.5,1.5
  rectangle: -15.5,-1.5 -14.5,-0.5
  rectangle: -13.5,-1.5 -12.5,-0.5
  rectangle: -11.5,-1.5 -10.5,-0.5
  rectangle: -9.5,-1.5 -8.5,-0.5
  rectangle: -7.5,0.5 -6.5,1.5
  rectangle: -7.5,-1.5 -6.5,-0.5
  rectangle: -5.5,0.5 -4.5,1.5
  rectangle: -5.5,-1.5 -4.5,-0.5
  rectangle: -3.5,0.5 -2.5,1.5
  rectangle: -3.5,-1.5 -2.5,-0.5
  rectangle: -1.5,0.5 -0.5,1.5
  rectangle: -1.5,-1.5 -0.5,-0.5
  rectangle: 0.5,0.5 1.5,1.5
  rectangle: 0.5,-1.5 1.5,-0.5
  rectangle: 2.5,0.5 3.5,1.5
  rectangle: 2.5,-1.5 3.5,-0.5
  rectangle: 4.5,0.5 5.5,1.5
  rectangle: 4.5,-1.5 5.5,-0.5
  rectangle: 6.5,0.5 7.5,1.5
  rectangle: 6.5,-1.5 7.5,-0.5
  rectangle: 8.5,0.5 9.5,1.5
  rectangle: 8.5,-1.5 9.5,-0.5
  rectangle: 10.5,0.5 11.5,1.5
  rectangle: 10.5,-1.5 11.5,-0.5
  rectangle: 12.5,0.5 13.5,1.5
  rectangle: 12.5,-1.5 13.5,-0.5
  rectangle: 14.5,0.5 15.5,1.5
  rectangle: 14.5,-1.5 15.5,-0.5
  lines w0.051: -17.25,-1.75 -17,-1.75 ; -17.25,-0.75 -17,-0.75 ; -1,-3.75 -1,-3.25 ; 1,-3.75 1,-3.25 ; 17.25,1 17,1 ; 17.25,1.75 17,1.75 ; -17,-1.75 -16.5,-1.75 ; -17,-1.75 -17,-3.25 -1,-3.25 ; -17,-0.75 -16.5,-0.75 ; -17,-0.75 -17,3.25 17,3.25 17,1.75 ; -16.5,-1.75 -16.5,-0.75 ; -16.5,-1.75 -16.5,-3 -3.25,-3 -3.25,-2.75 -2.75,-2.75 -2.75,-3 -1,-3 -1,-3.25 ; -16.5,-0.75 -16.5,3 -15.25,3 -15.25,2.75 -14.75,2.75 -14.75,3 -13.25,3 -13.25,2.75 -12.75,2.75 -12.75,3 -11.25,3 -11.25,2.75 -10.75,2.75 -10.75,3 -9.25,3 -9.25,2.75 -8.75,2.75 -8.75,3 -7.25,3 -7.25,2.75 -6.75,2.75 -6.75,3 -5.25,3 -5.25,2.75 -4.75,2.75 -4.75,3 -3.25,3 -3.25,2.75 -2.75,2.75 -2.75,3 -1.25,3 -1.25,2.75 -0.75,2.75 -0.75,3 0.75,3 0.75,2.75 1.25,2.75 1.25,3 2.75,3 2.75,2.75 3.25,2.75 3.25,3 4.75,3 4.75,2.75 5.25,2.75 5.25,3 6.75,3 6.75,2.75 7.25,2.75 7.25,3 8.75,3 8.75,2.75 9.25,2.75 9.25,3 10.75,3 10.75,2.75 11.25,2.75 11.25,3 12.75,3 12.75,2.75 13.25,2.75 13.25,3 14.75,3 14.75,2.75 15.25,2.75 15.25,3 16.5,3 16.5,1.75 ; 1,-3.25 1,-3 2.75,-3 2.75,-2.75 3.25,-2.75 3.25,-3 16.5,-3 16.5,1 ; 1,-3.25 17,-3.25 17,1 ; 16.5,1 16.5,1.75 ; 16.5,1 17,1 ; 16.5,1.75 17,1.75
  text "1" at -16.25,-2.75 h0.94

## 105081-0001 [mm]
pads (24):
  round 1.3 hole 1.3: 1(-2,5) 1(2,5)
  round 0.9 hole 0.6: 1(2.2,11.05) 2(2.2,7.15) 3(2.75,9.85) 4(2.75,8.35) 5(1.65,9.85) 6(1.65,8.35) 7(1.1,11.05) 8(1.1,7.15) 9(0.55,9.85) 10(0.55,8.35) 11(-0.55,9.85) 12(-0.55,8.35) 13(-1.1,11.05) 14(-1.1,7.15) 15(-1.65,9.85) 16(-1.65,8.35) 17(-2.75,9.85) 18(-2.75,8.35)
  round 1 hole 0.7: 19(-2.2,11.05) 20(-2.2,7.15)
  oval 0.9x1.8 hole 0.6: M@1(-4.35,6.45) M@2(4.35,6.45)
Top Overlay:
  lines w0.203: -4.052,4.753 -4.052,-3.115 4.072,-3.115 4.072,4.733 ; -4.052,8.061 -4.052,11.484 cw(c-3.869,11.484) -3.869,11.667 3.869,11.667 cw(c3.869,11.464) 4.072,11.464 4.072,8.061 ; 0,-3.014 0,-2.383 -0.407,-1.67 -0.407,-0.815 cw(c-0.246,-0.815) -0.122,-0.713 0.081,-0.916 ccw(c0.216,-0.781) 0.407,-0.774 0.407,1.039 ccw(c0.219,1.039) 0.061,1.14 -0.081,0.977 cw(c-0.222,1.1) -0.407,1.12 -0.407,2.973 cw(c-0.246,2.973) -0.122,3.075 0.102,2.83 ccw(c0.232,2.95) 0.407,2.973 0.407,4.846 ccw(c0.238,4.846) 0.102,4.948 -0.081,4.744 cw(c-0.221,4.87) -0.407,4.887 -0.407,6.72 cw(c-0.239,6.719) -0.122,6.841 0.122,6.597 ccw(c0.241,6.716) 0.407,6.74 ; -2.769,-1.385 ccw(c-2.576,-1.385) -2.383,-1.385 -2.383,1.079 cw(c-1.894,1.079) -1.405,1.079 -1.405,-1.385 ccw(c-1.212,-1.385) -1.018,-1.385 -1.018,1.303 ccw(c-1.894,1.303) -2.769,1.303 -2.769,-1.385 ; 0.998,-1.385 ccw(c1.191,-1.385) 1.385,-1.385 1.385,1.079 cw(c1.873,1.079) 2.362,1.079 2.362,-1.385 ccw(c2.555,-1.385) 2.749,-1.385 2.749,1.303 ccw(c1.873,1.303) 0.998,1.303 0.998,-1.385
  lines w0.4: -4.317,8.241 -4.317,11.484 cw(c-3.869,11.484) -3.869,11.932 3.869,11.932 cw(c3.869,11.464) 4.337,11.464 4.337,8.221
Mechanical 1:
  lines w0: -4.095,0 4.095,0
Mechanical 11:
  lines w0: -4.65,5.55 ccw(c-4.35,5.55) -4.35,5.25 ccw(c-4.35,5.55) -4.05,5.55 -4.05,7.35 ccw(c-4.35,7.35) -4.35,7.65 ccw(c-4.35,7.35) -4.65,7.35 -4.65,5.55 ; 4.05,5.55 ccw(c4.35,5.55) 4.35,5.25 ccw(c4.35,5.55) 4.65,5.55 4.65,7.35 ccw(c4.35,7.35) 4.35,7.65 ccw(c4.35,7.35) 4.05,7.35 4.05,5.55
Mechanical 16:
  lines w0.203: -4.052,-3.115 -4.052,11.484 ; -1.405,11.586 -1.405,8.593 ccw(c-1.226,8.583) -1.181,8.409 0.142,8.756 cw(c0.211,8.572) 0.407,8.573 0.407,6.74 ; 4.072,-3.115 4.072,11.464 ; -0.611,9.529 0.611,9.55 0.611,10.751 -0.611,10.751 -0.611,9.529
  lines w0.4: -4.317,5.701 -4.317,11.484 ; 4.337,5.681 4.337,11.464

## 0446200001 [mil]
pads (10):
  round 128 hole 128: 1(-250,0) 1(250,0)
  round 56 hole 35: 1(140,100) 2(100,170) 3(60,100) 4(20,170) 5(-20,100) 6(-60,170) 7(-100,100) 8(-140,170)
Top Overlay:
  lines w8: -306.1,-195.87 306.1,-195.87 306.1,394.13 -306.1,394.13 -306.1,-195.87

## 0446200002 [mil]
pads (12):
  round 128 hole 128: 1(-250,0) 1(250,0)
  round 56 hole 35: 1(140,100) 2(100,170) 3(60,100) 4(20,170) 5(-20,100) 6(-60,170) 7(-100,100) 8(-140,170)
  round 90 hole 62: S@1(-319,135) S@2(319,135)
Top Overlay:
  lines w8: -350,70 cw(c-352.5,56.25) -340,50 ccw(c-140,-25) -320,-140 -310,-160 ; 310,-160 320,-140 ccw(c140,-25) 340,50 cw(c352.5,56.25) 350,70 ; -306.1,-195.87 306.1,-195.87 306.1,394.13 -306.1,394.13 -306.1,-195.87

## 534620621_SD [mm]
pads (12):
  rect 2.2x0.7 smd: 1(8.25,2.5) 2(8.25,1.5) 3(8.25,0.5) 4(8.25,-0.5) 5(8.25,-1.5) 6(8.25,-2.5)
  round 1.6 hole 1.6: 1(8.45,-5) 1(8.45,5)
  round 1.27 hole 1: M1(3.9,5.85) M2(5.4,5.85) M3(3.9,-5.85) M4(5.4,-5.85)
Top Overlay:
  lines w0.102: -6.395,-3.837 -6.395,5.009 ; 3.428,-6.501 2.878,-6.501 2.878,-6.182 -6.501,-6.182 -6.501,-6.714 -6.821,-6.714 -6.821,-5.968 cw(c-6.501,-5.968) -6.501,-5.649 -6.182,-5.649 -6.182,-3.943 -6.821,-3.943 -6.821,5.116 -6.182,5.116 -6.182,5.649 -6.501,5.649 cw(c-6.501,5.968) -6.821,5.968 -6.821,6.714 -6.501,6.714 -6.501,6.182 2.878,6.182 2.878,6.501 3.534,6.501 ; 6.928,-6.501 ccw(c6.927,-5.862) 7.567,-5.862 ; 7.034,6.501 cw(c7.034,5.968) 7.567,5.968 7.567,3.138 ; 7.141,-4.862 7.141,-3.031 ; 7.141,3.138 7.141,4.968 ; 7.567,-3.031 7.567,-5.862 ; 7.674,-3.517 8.846,-3.517 cw(c8.846,-3.943) 9.273,-3.943 9.273,-5.436 cw(c8.846,-5.435) 8.846,-5.862 7.567,-5.862 ; 7.674,3.517 8.846,3.517 ccw(c8.846,3.943) 9.273,3.943 9.273,5.436 ccw(c8.846,5.435) 8.846,5.862 7.674,5.862 ; -4.903,-4.157 0.959,-4.157 ccw(c0.959,-3.517) 1.599,-3.517 1.599,-2.025 ccw(c0.959,-2.025) 0.959,-1.386 -4.903,-1.386 ccw(c-4.903,-1.652) -4.903,-1.918 cw(c-4.902,-26.003) -1.705,-2.132 -1.386,-1.918 0.746,-1.918 cw(c0.746,-2.238) 1.066,-2.238 1.066,-3.304 cw(c0.746,-3.304) 0.746,-3.624 -1.386,-3.624 -1.705,-3.41 cw(c-4.904,20.46) -4.903,-3.624 ccw(c-4.903,-3.89) -4.903,-4.157 ; -4.903,1.386 0.959,1.386 ccw(c0.959,2.025) 1.599,2.025 1.599,3.517 ccw(c0.959,3.517) 0.959,4.157 -4.903,4.157 ccw(c-4.903,3.89) -4.903,3.624 cw(c-4.904,-20.46) -1.705,3.41 -1.386,3.624 0.746,3.624 cw(c0.746,3.304) 1.066,3.304 1.066,2.238 cw(c0.746,2.238) 0.746,1.918 -1.386,1.918 -1.705,2.132 cw(c-4.902,26.003) -4.903,1.918 ccw(c-4.903,1.652) -4.903,1.386
Mechanical 11:
  lines w0: 3.4,-5.85 cw(c3.9,-5.85) 3.9,-5.35 5.4,-5.35 cw(c5.4,-5.85) 5.9,-5.85 cw(c5.4,-5.85) 5.4,-6.35 3.9,-6.35 cw(c3.9,-5.85) 3.4,-5.85 ; 3.4,5.85 cw(c3.9,5.85) 3.9,6.35 5.4,6.35 cw(c5.4,5.85) 5.9,5.85 cw(c5.4,5.85) 5.4,5.35 3.9,5.35 cw(c3.9,5.85) 3.4,5.85
Mechanical 16:
  rectangle: 7.15,2.25 9.05,2.75
  rectangle: 7.15,1.25 9.05,1.75
  rectangle: 7.15,0.25 9.05,0.75
  rectangle: 7.15,-0.75 9.05,-0.25
  rectangle: 7.15,-1.75 9.05,-1.25
  rectangle: 7.15,-2.75 9.05,-2.25
  lines w0.102: 2.878,-6.501 6.928,-6.501 ; 2.878,-6.182 6.821,-6.182 ccw(c6.821,-5.862) 7.141,-5.862 7.141,5.968 ccw(c6.928,5.968) 6.928,6.182 2.878,6.182 ; 2.878,6.501 7.034,6.501 ; 7.567,-5.862 7.567,5.968